# Altium integrated library PlantiumIntegratedLibrary.IntLib: 638 symbols (part 4 of 6) (continued)
## SC-P82B96TDT (continued)
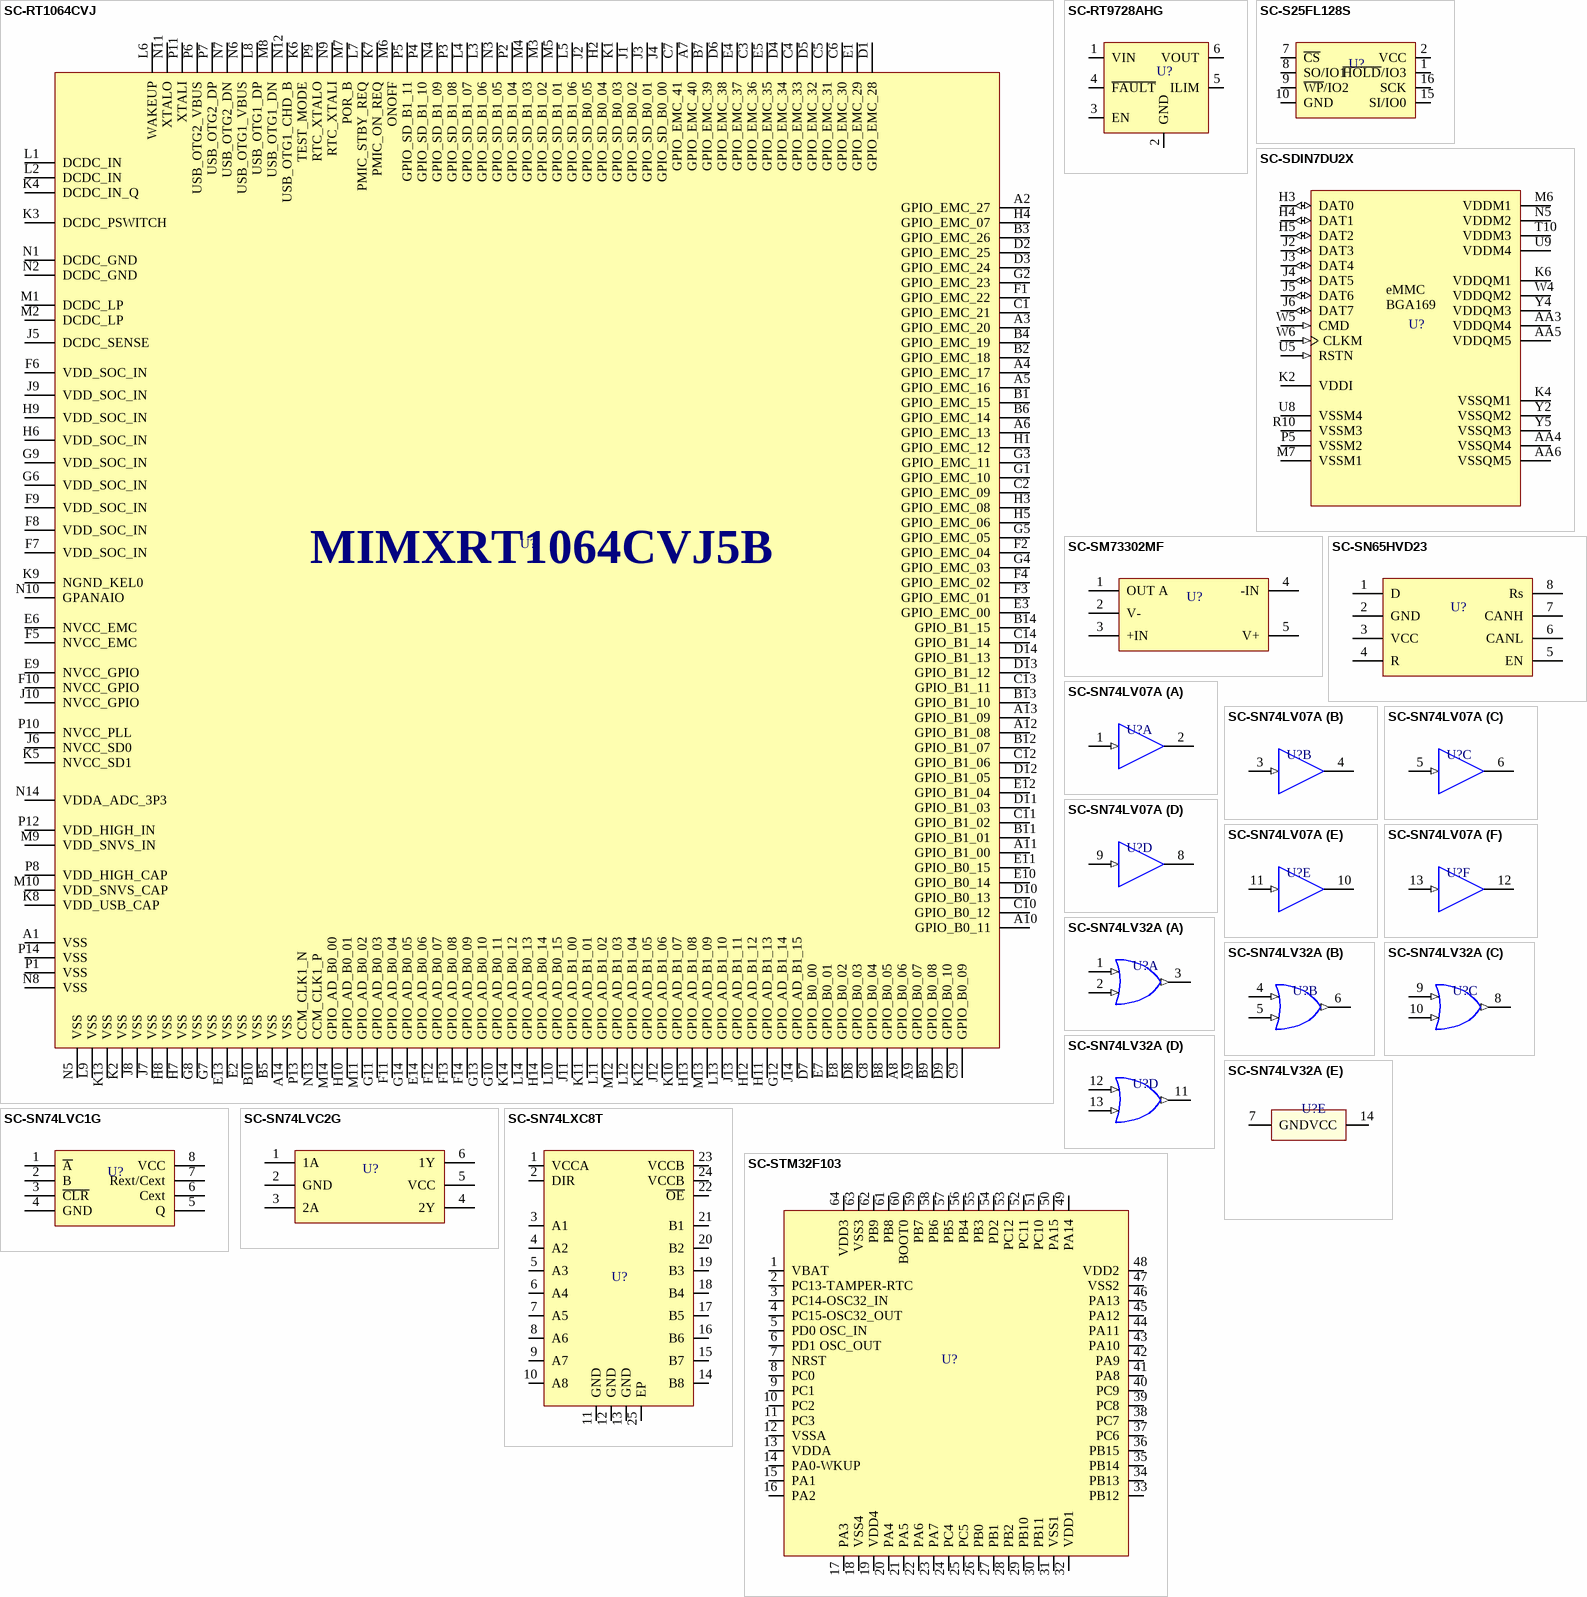
[diagram p20: symbols SC-RT1064CVJ to SC-STM32F103]

## SC-RT1064CVJ
designator U?
ARM® Cortex®-M7 series Microcontroller IC 32-Bit 528MHz 4MB (4M x 8) FLASH 196-LFBGA (12x12); Manufacturer Part Number: MIMXRT1064CVJ5B; Manufacturer: NXP USA Inc.; Working Temperature: -40°C ~ 105°C (TJ); Temperature Coefficient: NC; Short Description: IC MCU 32BIT 4MB FLASH 196LFBGA; Ratings: REACH, ROHS3; Voltage: 3V ~ 3.6V; Value: NC; Mounting: SMT; Power: NC; Type: NC; Frequency: 528MHz; Alternate Part Number 1: *; Alternate Part Number 2: *; Tolerance: NC; Current: NC; Revision Date: 25/08/21; Package Reference: LFBGA-196
footprint LFBGA-196_12x12
pins: A1 VSS, A2 GPIO_EMC_27, A3 GPIO_EMC_20, A4 GPIO_EMC_17, A5 GPIO_EMC_16, A6 GPIO_EMC_13, A7 GPIO_EMC_40, A8 GPIO_B0_06, A9 GPIO_B0_07, A10 GPIO_B0_11, A11 GPIO_B1_00, A12 GPIO_B1_08, A13 GPIO_B1_09, A14 VSS, B1 GPIO_EMC_15, B2 GPIO_EMC_18, B3 GPIO_EMC_26, B4 GPIO_EMC_19, B5 VSS, B6 GPIO_EMC_14, B7 GPIO_EMC_39, B8 GPIO_B0_05, B9 GPIO_B0_08, B10 VSS, B11 GPIO_B1_01, B12 GPIO_B1_07, B13 GPIO_B1_10, B14 GPIO_B1_15, C1 GPIO_EMC_21, C2 GPIO_EMC_09, C3 GPIO_EMC_36, C4 GPIO_EMC_33, C5 GPIO_EMC_31, C6 GPIO_EMC_30, C7 GPIO_EMC_41, C8 GPIO_B0_04, C9 GPIO_B0_09, C10 GPIO_B0_12, C11 GPIO_B1_02, C12 GPIO_B1_06, C13 GPIO_B1_11, C14 GPIO_B1_14, D1 GPIO_EMC_28, D2 GPIO_EMC_25, D3 GPIO_EMC_24, D4 GPIO_EMC_34, D5 GPIO_EMC_32, D6 GPIO_EMC_38, D7 GPIO_B0_00, D8 GPIO_B0_03, D9 GPIO_B0_10, D10 GPIO_B0_13, D11 GPIO_B1_03, D12 GPIO_B1_05, D13 GPIO_B1_12, D14 GPIO_B1_13, E1 GPIO_EMC_29, E2 VSS, E3 GPIO_EMC_00, E4 GPIO_EMC_37, E5 GPIO_EMC_35, E6 NVCC_EMC, E7 GPIO_B0_01, E8 GPIO_B0_02, E9 NVCC_GPIO, E10 GPIO_B0_14, E11 GPIO_B0_15, E12 GPIO_B1_04, E13 VSS, E14 GPIO_AD_B0_06, F1 GPIO_EMC_22, F2 GPIO_EMC_04, F3 GPIO_EMC_01, F4 GPIO_EMC_02, F5 NVCC_EMC, F6 VDD_SOC_IN, F7 VDD_SOC_IN, F8 VDD_SOC_IN, F9 VDD_SOC_IN, F10 NVCC_GPIO, F11 GPIO_AD_B0_04, F12 GPIO_AD_B0_07, F13 GPIO_AD_B0_08, F14 GPIO_AD_B0_09, G1 GPIO_EMC_10, G2 GPIO_EMC_23, G3 GPIO_EMC_11, G4 GPIO_EMC_03, G5 GPIO_EMC_05, G6 VDD_SOC_IN, G7 VSS, G8 VSS, G9 VDD_SOC_IN, G10 GPIO_AD_B0_11, G11 GPIO_AD_B0_03, G12 GPIO_AD_B1_14, G13 GPIO_AD_B0_10, G14 GPIO_AD_B0_05, H1 GPIO_EMC_12, H2 GPIO_SD_B0_04, H3 GPIO_EMC_08, H4 GPIO_EMC_07, H5 GPIO_EMC_06, H6 VDD_SOC_IN, H7 VSS, H8 VSS, H9 VDD_SOC_IN, H10 GPIO_AD_B0_01, H11 GPIO_AD_B1_13, H12 GPIO_AD_B1_12, H13 GPIO_AD_B1_08, H14 GPIO_AD_B0_14, J1 GPIO_SD_B0_02, J2 GPIO_SD_B0_05, J3 GPIO_SD_B0_01, J4 GPIO_SD_B0_00, J5 DCDC_SENSE, J6 NVCC_SD0, J7 VSS, J8 VSS, J9 VDD_SOC_IN, J10 NVCC_GPIO, J11 GPIO_AD_B1_00, J12 GPIO_AD_B1_06, J13 GPIO_AD_B1_11, J14 GPIO_AD_B1_15, K1 GPIO_SD_B0_03, K2 VSS, K3 DCDC_PSWITCH, K4 DCDC_IN_Q, K5 NVCC_SD1, K6 TEST_MODE, K7 PMIC_ON_REQ, K8 VDD_USB_CAP, K9 NGND_KEL0, K10 GPIO_AD_B1_07, K11 GPIO_AD_B1_01, K12 GPIO_AD_B1_05, K13 VSS, K14 GPIO_AD_B0_12, L1 DCDC_IN, L2 DCDC_IN, L3 GPIO_SD_B1_06, L4 GPIO_SD_B1_07, L5 GPIO_SD_B1_06, L6 WAKEUP, L7 PMIC_STBY_REQ, L8 USB_OTG1_DP, L9 VSS, L10 GPIO_AD_B0_15, L11 GPIO_AD_B1_02, L12 GPIO_AD_B1_04, L13 GPIO_AD_B1_10, L14 GPIO_AD_B0_13, M1 DCDC_LP, M2 DCDC_LP, M3 GPIO_SD_B1_02, M4 GPIO_SD_B1_03, M5 GPIO_SD_B1_01, M6 ONOFF, M7 POR_B, M8 USB_OTG1_DN, M9 VDD_SNVS_IN, M10 VDD_SNVS_CAP, M11 GPIO_AD_B0_02, M12 GPIO_AD_B1_03, M13 GPIO_AD_B1_09, M14 GPIO_AD_B0_00, N1 DCDC_GND, N2 DCDC_GND, N3 GPIO_SD_B1_05, N4 GPIO_SD_B1_09, N5 VSS, N6 USB_OTG1_VBUS, N7 USB_OTG2_DN, N8 VSS, N9 RTC_XTALI, N10 GPANAIO, N11 XTALO, N12 USB_OTG1_CHD_B, N13 CCM_CLK1_P, N14 VDDA_ADC_3P3, P1 VSS, P2 GPIO_SD_B1_04, P3 GPIO_SD_B1_08, P4 GPIO_SD_B1_10, P5 GPIO_SD_B1_11, P6 USB_OTG2_VBUS, P7 USB_OTG2_DP, P8 VDD_HIGH_CAP, P9 RTC_XTALO, P10 NVCC_PLL, P11 XTALI, P12 VDD_HIGH_IN, P13 CCM_CLK1_N, P14 VSS

## SC-RT9728AHG
designator U?
Power Switch/Driver 1:1 P-Channel 1.3A SOT-23-6; Manufacturer Part Number: RT9728AHGE; Manufacturer: Richtek USA Inc.; Working Temperature: -40°C ~ 85°C (TA); Temperature Coefficient: NC; Short Description: IC PWR SWITCH P-CHAN 1:1 SOT23-6; Ratings: REACH, ROHS3; Voltage: 2.5V ~ 5.5V; Value: NC; Mounting: SMT; Power: NC; Type: High Side; Frequency: NC; Alternate Part Number 1: *; Alternate Part Number 2: *; Tolerance: NC; Current: 1.3A; Revision Date: 03/08/21; Package Reference: SOT-23-6
footprint SOT-23-6 (Footprint not found)
pins: 1 VIN, 2 GND, 3 EN, 4 ~{FAULT} , 5 ILIM, 6 VOUT

## SC-S25FL128S
designator U?
FLASH - NOR Memory IC 128Mb (16M x 8) SPI - Quad I/O 133 MHz 16-SOIC; Manufacturer Part Number: S25FL128SAGMFI001; Manufacturer: Cypress Semiconductor Corp; Working Temperature: -40°C ~ 85°C (TA); Temperature Coefficient: NC; Short Description: IC FLASH 128MBIT SPI/QUAD 16SOIC; Ratings: REACH, ROHS3; Frequency: 133 MHz; Voltage: 2.7V ~ 3.6V; Value: NC; Mounting: SMT; Power: NC; Type: NC; Alternate Part Number 1: *; Alternate Part Number 2: *; Tolerance: NC; Current: NC; Revision Date: 17/11/21; Package Reference: 16-SOIC
footprint SOIC-16W
pins: 1 ~{HOLD}/IO3, 2 VCC, 7 ~{CS}, 8 SO/IO1, 9 ~{WP}/IO2, 10 GND, 15 SI/IO0, 16 SCK

## SC-SDIN7DU2X
designator U?
iNAND eMMC Flash 8Gb; Manufacturer Part Number: SDIN7DU2-8G; Manufacturer: Sandisk; Working Temperature: –25°C ~ +85°C; Temperature Coefficient: NC; Short Description: ND; Value: NC; Mounting: SMT; Power: NC; Ratings: *; Type: NC; Frequency: NC; Alternate Part Number 1: *; Alternate Part Number 2: *; Tolerance: NC; Current: NC; Revision Date: 03/08/21; Package Reference: *; Voltage: NC
footprint BGA-153
pins: AA3 VDDQM4 (power) "DQ Power", AA4 VSSQM4 (power) "DQ Ground", AA5 VDDQM5 (power) "DQ Power", AA6 VSSQM5 (power) "DQ Ground", H3 DAT0 (io) "Data Input/Output 0", H4 DAT1 (io) "Data Input/Output 1", H5 DAT2 (io) "Data Input/Output 2", J2 DAT3 (io) "Data Input/Output 3", J3 DAT4 (io) "Data Input/Output 4", J4 DAT5 (io) "Data Input/Output 5", J5 DAT6 (io) "Data Input/Output 6", J6 DAT7 (io) "Data Input/Output 7", K2 VDDI "No Connect", K4 VSSQM1 (power) "DQ Ground", K6 VDDQM1 (power) "DQ Power", M6 VDDM1 (power) "Power Supply", M7 VSSM1 (power) "Ground", N5 VDDM2 (power) "Power Supply", P5 VSSM2 (power) "Ground", R10 VSSM3 (power) "Ground", T10 VDDM3 (power) "Power Supply", U5 RSTN (in) "Clock Enable", U8 VSSM4 (power) "Ground", U9 VDDM4 (power) "Power Supply", W4 VDDQM2 (power) "DQ Power", W5 CMD (in) "Bank Address Input 1", W6 CLKM (in) "Clock", Y2 VSSQM2 (power) "DQ Ground", Y4 VDDQM3 (power) "DQ Power", Y5 VSSQM3 (power) "DQ Ground"
text: eMMC / BGA169

## SC-SM73302MF
designator U?
General Purpose Amplifier 1 Circuit Rail-to-Rail SOT-23-5; Manufacturer Part Number: SM73302MF/NOPB; Alternate Part Number 1: AD8601ARTZ; Manufacturer: Texas Instruments; Working Temperature: -40°C ~ 125°C; Temperature Coefficient: NC; Short Description: IC OPAMP GP 1 CIRCUIT SOT23-5; Ratings: ROHS3; Voltage: 2V ~ 5.5V; Value: NC; Mounting: SMT; Power: NC; Type: NC; Frequency: NC; Alternate Part Number 2: *; Tolerance: NC; Current: NC; Revision Date: 30/09/22; Package Reference: SOT-23-5
footprint SOT-23-5
pins: 1 OUT A, 2 V-, 3 +IN, 4 -IN, 5 V+

## SC-SN65HVD23
designator U?
1/1 Transceiver Half CANbus 8-SOIC; Manufacturer Part Number: SN65HVD234DR; Manufacturer: Texas Instruments; Working Temperature: -40°C ~ 125°C; Temperature Coefficient: NC; Short Description: IC TRANSCEIVER HALF 1/1 8SOIC; Ratings: REACH, ROHS3; Frequency: 1Mbps; Voltage: 3V ~ 3.6V; Value: NC; Mounting: SMT; Power: NC; Type: Half-Duplex; Alternate Part Number 1: *; Alternate Part Number 2: *; Tolerance: NC; Current: NC; Revision Date: 03/08/21; Package Reference: SOIC-8N
footprint SOIC-8N (Footprint not found)
pins: 1 D, 2 GND, 3 VCC, 4 R, 5 EN, 6 CANL, 7 CANH, 8 Rs

## SC-SN74LV07A
designator U?
Buffer, Non-Inverting 6 Element 1 Bit per Element Open Drain Output 14-TSSOP; Manufacturer Part Number: SN74LV07APWR; Manufacturer: Texas Instruments; Working Temperature: -40°C ~ 125°C (TA); Temperature Coefficient: NC; Short Description: IC BUF NON-INVERT 5.5V 14TSSOP; Ratings: REACH, ROHS3; Voltage: 2V ~ 5.5V; Value: NC; Mounting: SMT; Power: NC; Type: Buffer; Frequency: NC; Alternate Part Number 1: *; Alternate Part Number 2: *; Tolerance: NC; Current: NC; Revision Date: 03/08/21; Package Reference: TSSOP-14
footprint TSSOP-14 (Footprint not found)
part A pins: 1 A (in), 2 Y (oc)
part B pins: 3 A (in), 4 Y (oc)
part C pins: 5 A (in), 6 Y (oc)
part D pins: 8 Y (oc), 9 A (in)
part E pins: 10 Y (oc), 11 A (in)
part F pins: 12 Y (oc), 13 A (in)

## SC-SN74LV32A
designator U?
OR GATE, 4CH; Manufacturer Part Number: SN74LV32APWR; Manufacturer: Texas Instruments; Working Temperature: -40°C ~ 125°C (TA); Temperature Coefficient: NC; Short Description: IC GATE OR 4CH 2-INP; Ratings: ROHS3; Voltage: 2V ~ 5.5V; Value: NC; Mounting: SMT; Power: NC; Type: NC; Frequency: NC; Alternate Part Number 1: *; Alternate Part Number 2: *; Tolerance: NC; Current: NC; Revision Date: 26/06/23; Package Reference: TSSOP-14
footprint TSSOP-14
part A pins: 1 1A (in), 2 1B (in), 3 1Y (out)
part B pins: 4 2A (in), 5 2B (in), 6 2Y (out)
part C pins: 8 3Y (out), 9 3A (in), 10 3B (in)
part D pins: 11 3Y (out), 12 3A (in), 13 3B (in)
part E pins: 7 GND (power), 14 VCC (power)

## SC-SN74LVC1G
designator U?
Monostable Multivibrator 18.5 ns SM8; Manufacturer Part Number: SN74LVC1G123DCTR; Manufacturer: Texas Instruments; Working Temperature: -40°C ~ 125°C; Temperature Coefficient: NC; Short Description: IC MULTIVIBRATOR 18.5NS SM8; Ratings: REACH, ROHS3; Voltage: 1.65 V ~ 5.5 V; Value: NC; Mounting: SMT; Power: NC; Type: Monostable; Frequency: NC; Alternate Part Number 1: *; Alternate Part Number 2: *; Tolerance: NC; Current: NC; Revision Date: 03/08/21; Package Reference: MSOP-8
footprint MSOP-8 (Footprint not found)
pins: 1 ~{A}, 2 B, 3 ~{CLR}, 4 GND, 5 Q, 6 Cext, 7 Rext/Cext, 8 VCC

## SC-SN74LVC2G
designator U?
Buffer, Non-Inverting 2 Element 1 Bit per Element Open Drain Output SC-70-6; Manufacturer Part Number: SN74LVC2G07DCKR; Manufacturer: Texas Instruments; Working Temperature: -40°C ~ 125°C (TA); Temperature Coefficient: NC; Short Description: SN74LVC2G07 DUAL BUFFER/DRIVER W; Ratings: ND; Voltage: 1.65V ~ 5.5V; Value: NC; Mounting: SMT; Power: NC; Type: Buffer; Frequency: NC; Alternate Part Number 1: *; Alternate Part Number 2: *; Tolerance: NC; Current: NC; Revision Date: 03/08/21; Package Reference: SOT-363-6
footprint SOT-363-6 (Footprint not found)
pins: 1 1A, 2 GND, 3 2A, 4 2Y, 5 VCC, 6 1Y

## SC-SN74LXC8T
designator U?
Voltage Level Translator Bidirectional 1 Circuit 8 Channel 420Mbps 24-VQFN (5.5x3.5); Manufacturer Part Number: SN74LXC8T245RHLR; Manufacturer: Texas Instruments; Working Temperature: -40°C ~ 125°C (TA); Temperature Coefficient: NC; Short Description: 8-BIT DUAL-SUPPLY BUS TRANSCEIVE; Ratings: REACH, ROHS3; Value: NC; Mounting: SMT; Power: NC; Type: NC; Frequency: NC; Alternate Part Number 1: *; Alternate Part Number 2: *; Tolerance: NC; Current: NC; Revision Date: 24/09/21; Package Reference: VQFN-24; Voltage: NC
footprint VQFN-24_5.5X3.5
pins: 1 VCCA, 2 DIR, 3 A1, 4 A2, 5 A3, 6 A4, 7 A5, 8 A6, 9 A7, 10 A8, 11 GND, 12 GND, 13 GND, 14 B8, 15 B7, 16 B6, 17 B5, 18 B4, 19 B3, 20 B2, 21 B1, 22 ~{OE}, 23 VCCB, 24 VCCB, 25 EP

## SC-STM32F103
designator U?
ARM® Cortex®-M3 series Microcontroller IC 32-Bit 72MHz 256KB (256K x 8) FLASH 64-LQFP (10x10); Manufacturer Part Number: STM32F103RCT7; Manufacturer: STMicroelectronics; Working Temperature: -40°C ~ 105°C (TA); Temperature Coefficient: NC; Short Description: IC MCU 32BIT 256KB FLASH 64LQFP; Ratings: REACH, ROHS3; Voltage: 2V ~ 3.6V; Value: NC; Mounting: SMT; Power: NC; Type: ARM® Cortex®-M3; Frequency: 72MHz; Alternate Part Number 1: *; Alternate Part Number 2: *; Tolerance: NC; Current: NC; Revision Date: 03/08/21; Package Reference: LQFP-64
footprint LQFP-64 (Footprint not found)
pins: 1 VBAT, 2 PC13-TAMPER-RTC, 3 PC14-OSC32_IN, 4 PC15-OSC32_OUT, 5 PD0 OSC_IN, 6 PD1 OSC_OUT, 7 NRST, 8 PC0, 9 PC1, 10 PC2, 11 PC3, 12 VSSA, 13 VDDA, 14 PA0-WKUP, 15 PA1, 16 PA2, 17 PA3, 18 VSS4, 19 VDD4, 20 PA4, 21 PA5, 22 PA6, 23 PA7, 24 PC4, 25 PC5, 26 PB0, 27 PB1, 28 PB2, 29 PB10, 30 PB11, 31 VSS1, 32 VDD1, 33 PB12, 34 PB13, 35 PB14, 36 PB15, 37 PC6, 38 PC7, 39 PC8, 40 PC9, 41 PA8, 42 PA9, 43 PA10, 44 PA11, 45 PA12, 46 PA13, 47 VSS2, 48 VDD2, 49 PA14, 50 PA15, 51 PC10, 52 PC11, 53 PC12, 54 PD2, 55 PB3, 56 PB4, 57 PB5, 58 PB6, 59 PB7, 60 BOOT0, 61 PB8, 62 PB9, 63 VSS3, 64 VDD3

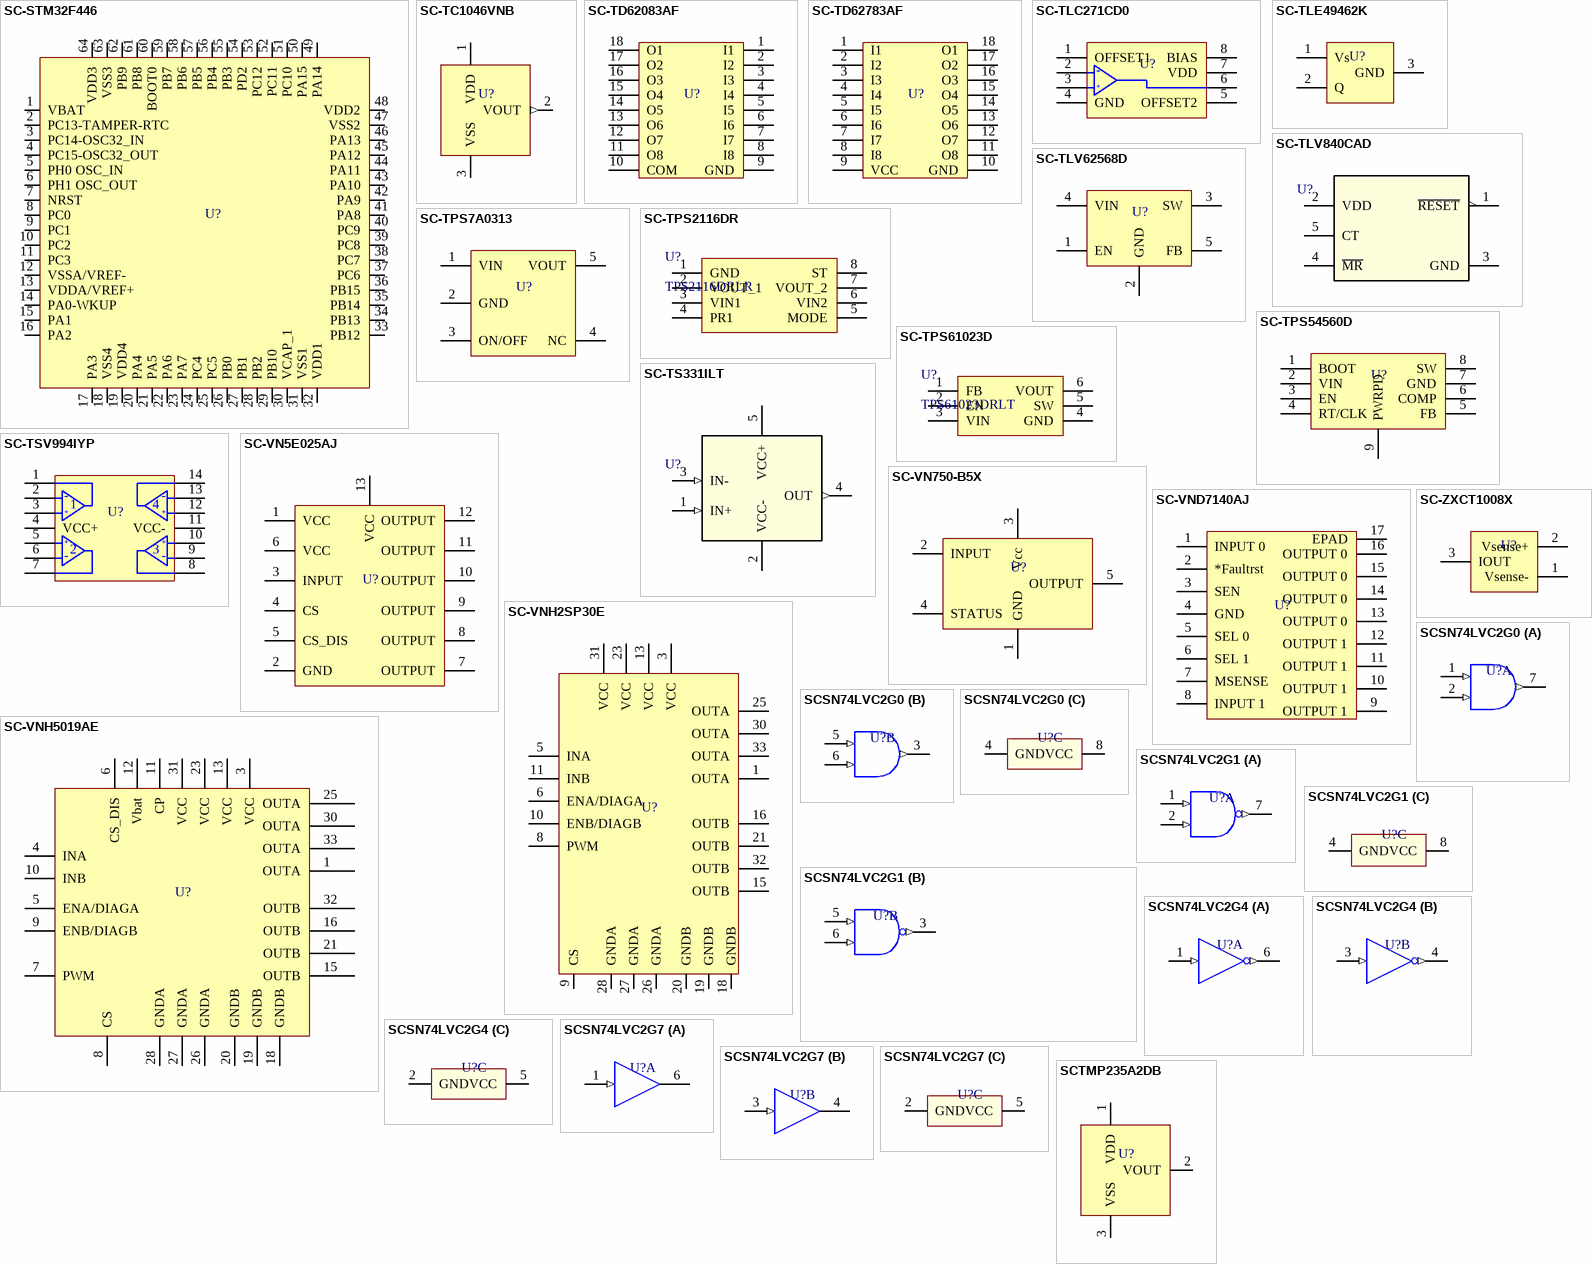
[diagram p21: symbols SC-STM32F446 to SCTMP235A2DB]

## SC-STM32F446
designator U?
ARM® Cortex®-M4 series Microcontroller IC 32-Bit 180MHz 512KB (512K x 8) FLASH 64-LQFP (10x10); Manufacturer Part Number: STM32F446RET6; Manufacturer: STMicroelectronics; Working Temperature: -40°C ~ 85°C (TA); Temperature Coefficient: NC; Short Description: IC MCU 32BIT 512KB FLASH 64LQFP; Ratings: REACH, ROHS3; Voltage: 1.7V ~ 3.6V; Value: NC; Mounting: SMT; Power: NC; Type: ARM® Cortex®-M4; Frequency: 180MHz; Alternate Part Number 1: *; Alternate Part Number 2: *; Tolerance: NC; Current: NC; Revision Date: 03/08/21; Package Reference: LQFP-64
footprint LQFP-64 (Footprint not found)
pins: 1 VBAT, 2 PC13-TAMPER-RTC, 3 PC14-OSC32_IN, 4 PC15-OSC32_OUT, 5 PH0 OSC_IN, 6 PH1 OSC_OUT, 7 NRST, 8 PC0, 9 PC1, 10 PC2, 11 PC3, 12 VSSA/VREF-, 13 VDDA/VREF+, 14 PA0-WKUP, 15 PA1, 16 PA2, 17 PA3, 18 VSS4, 19 VDD4, 20 PA4, 21 PA5, 22 PA6, 23 PA7, 24 PC4, 25 PC5, 26 PB0, 27 PB1, 28 PB2, 29 PB10, 30 VCAP_1, 31 VSS1, 32 VDD1, 33 PB12, 34 PB13, 35 PB14, 36 PB15, 37 PC6, 38 PC7, 39 PC8, 40 PC9, 41 PA8, 42 PA9, 43 PA10, 44 PA11, 45 PA12, 46 PA13, 47 VSS2, 48 VDD2, 49 PA14, 50 PA15, 51 PC10, 52 PC11, 53 PC12, 54 PD2, 55 PB3, 56 PB4, 57 PB5, 58 PB6, 59 PB7, 60 BOOT0, 61 PB8, 62 PB9, 63 VSS3, 64 VDD3

## SC-TC1046VNB
designator U?
Temperature Sensor Analog, Local -40°C ~ 125°C 6.25mV/°C SOT-23-3; Manufacturer Part Number: TC1046VNBTR; Manufacturer: Microchip Technology; Temperature Coefficient: NC; Short Description: SENSOR ANALOG -40C-125C SOT23-3; Ratings: REACH, ROHS3; Voltage: 2.7V ~ 4.4V; Value: NC; Working Temperature: -40°C ~ 125°C; Mounting: SMT; Power: NC; Type: Temperature Sensor; Frequency: NC; Alternate Part Number 1: *; Alternate Part Number 2: *; Tolerance: NC; Current: NC; Revision Date: 03/08/21; Package Reference: SOT-23-3; ComponentLink1Description: Datasheet; ComponentLink1URL: https://ww1.microchip.com/downloads/aemDocuments/documents/APID/ProductDocuments/DataSheets/21496C.pdf
footprint SOT-23-3 (Footprint not found)
pins: 1 VDD (power), 2 VOUT (out), 3 VSS (power)

## SC-TD62083AF
designator U?
8/0 D Darlington driver - 18-SSOP; Manufacturer Part Number: TD62083AFNG(O,N,EL; Manufacturer: Toshiba Semiconductor and Storage; Working Temperature: -40°C ~ 85°C; Temperature Coefficient: NC; Short Description: IC DRIVER 8/0 18SSOP; Ratings: ND; Current: 500mA; Voltage: 5V; Value: NC; Mounting: SMT; Power: NC; Type: Driver; Frequency: NC; Alternate Part Number 1: *; Alternate Part Number 2: *; Tolerance: NC; Revision Date: 03/08/21; Package Reference: SSOP-18
footprint SSOP-18 (Footprint not found)
pins: 1 I1, 2 I2, 3 I3, 4 I4, 5 I5, 6 I6, 7 I7, 8 I8, 9 GND, 10 COM, 11 O8, 12 O7, 13 O6, 14 O5, 15 O4, 16 O3, 17 O2, 18 O1

## SC-TD62783AF
designator U?
Source-type darlington driver; Manufacturer Part Number: TD62783AFNG(O,S); Manufacturer: Toshiba Semiconductor and Storage; Working Temperature: -40°C ~ 85°C; Temperature Coefficient: NC; Short Description: ND; Current: -500mA; Voltage: 5V; Value: NC; Mounting: SMT; Power: NC; Ratings: ND; Type: Driver; Frequency: NC; Alternate Part Number 1: *; Alternate Part Number 2: *; Tolerance: NC; Revision Date: 03/08/21; Package Reference: SSOP-18
footprint SSOP-18 (Footprint not found)
pins: 1 I1, 2 I2, 3 I3, 4 I4, 5 I5, 6 I6, 7 I7, 8 I8, 9 VCC, 10 GND, 11 O8, 12 O7, 13 O6, 14 O5, 15 O4, 16 O3, 17 O2, 18 O1

## SC-TLC271CD0
designator U?
General Purpose Amplifier Circuit - 8-SOIC; Manufacturer Part Number: TLC271CD; Manufacturer: Texas Instruments; Working Temperature: 0°C ~ 70°C; Temperature Coefficient: NC; Short Description: IC OPAMP GP 1 CIRCUIT 8SOIC; Ratings: REACH, ROHS3; Voltage: 3V ~ 16V, ±1.5V ~ 8V; Value: NC; Mounting: SMT; Power: NC; Type: OPAMP; Frequency: NC; Alternate Part Number 1: *; Alternate Part Number 2: *; Tolerance: NC; Current: NC; Revision Date: 03/08/21; Package Reference: SOIC-8N
footprint SOIC-8N (Footprint not found)
pins: 1 OFFSET1, 2 IN1-, 3 IN1+, 4 GND, 5 OFFSET2, 6 OUT, 7 VDD, 8 BIAS
text: -; +

## SC-TLE49462K
designator U?
Board Mount Hall Effect / Magnetic Sensors HALLEFFECT IC'S; Manufacturer Part Number: TLE4946-2K; Alternate Part Number 1: SS30AT; Alternate Part Number 2: S-57P1NBL8S-M3T4U; Manufacturer: Infineon Technologies; Working Temperature: -40°C ~ 140°C; Temperature Coefficient: NC; Short Description: HALL EFFECT SENSOR; Ratings: REACH, ROHS3, AECQ200; Current: 20mA; Voltage: 18V; Value: NC; Mounting: SMT; Power: NC; Type: LATCH; Frequency: NC; Tolerance: NC; Revision Date: 15/10/21; Package Reference: SOT-23-3
footprint SOT-23-3 (Footprint not found)
pins: 1 Vs, 2 Q, 3 GND

## SC-TLV840CAD
designator U?
Supervisor Open Drain or Open Collector 1 Channel SOT-23-5; Manufacturer Part Number: TLV840CADL14DBVR; Manufacturer: Texas Instruments; Working Temperature: –40°C to +125°C; Temperature Coefficient: NC; Short Description: LOW-VOLTAGE SUPERVISOR WITH ADJU; Ratings: ROHS3; REACH; EAR99; 8542.39.0001; Tolerance: 0.5%; Current: 120 nA; Voltage: 0.7 V to 6 V; Value: 1.4V; Mounting: SMD; Power: NC; Type: open-drain, active-low; Frequency: NC; Alternate Part Number 1: *; Alternate Part Number 2: *; Revision Date: 25/11/2022; Package Reference: SOT-23-5; ComponentLink1Description: Datasheet; ComponentLink1URL: https://www.ti.com/lit/ds/symlink/tlv840.pdf
footprint SOT-23-5
pins: 1 ~{RESET} (oc) "Active-Low Open-drain Output Reset Signal", 2 VDD (power) "Input Supply Voltage", 3 GND (power) "Ground", 4 ~{MR} "Manual Reset", 5 CT "Capacitor Time Delay Pin"

## SC-TLV62568D
designator U?
Buck Switching Regulator IC Positive Adjustable 0.6V 1 Output 1A SC-74A, SOT-753; Manufacturer Part Number: TLV62568DBVR; Alternate Part Number 1: NX4108CZ1TR; Manufacturer: Texas Instruments; Working Temperature: -40°C ~ 125°C (TJ); Temperature Coefficient: NC; Short Description: IC REG BUCK ADJ 1A SOT23-5; Ratings: REACH, ROHS3; Frequency: 1.5MHz; Voltage: 5.5V; Value: NC; Mounting: SMT; Power: NC; Type: Buck; Alternate Part Number 2: *; Tolerance: NC; Current: 1A; Revision Date: 03/08/21; Package Reference: SOT-23-5
footprint SOT-23-5 (Footprint not found)
pins: 1 EN, 2 GND, 3 SW, 4 VIN, 5 FB

## SC-TPS7A0313
designator U?
Linear Voltage Regulator IC Positive Fixed 1 Output 200mA SOT-23-5; Manufacturer Part Number: TPS7A0313PDBVR; Alternate Part Number 1: S-1312D13-M5T1U3; Manufacturer: Texas Instruments; Working Temperature: -40°C ~ 125°C (TJ); Temperature Coefficient: NC; Short Description: 200-MA, NANOPOWER-IQ (200 NA), L; Ratings: ROHS3; Value: NC; Mounting: SMT; Power: NC; Type: LDO; Frequency: NC; Alternate Part Number 2: *; Tolerance: NC; Current: 200mA; Revision Date: 23/11/21; Package Reference: SOT-23-5; Voltage: NC
footprint SOT-23-5
pins: 1 VIN, 2 GND, 3 ON/OFF, 4 NC, 5 VOUT

## SC-TPS2116DR
designator U?, comment TPS2116DRLR
Power Switch ICs - Power Distribution 1.6-V to 5.5-V, 40-mOhm, 2.5-A, low-IQ, priority power multiplexer; Manufacturer_Name: Texas Instruments; Datasheet Link: https://www.ti.com/lit/gpn/tps2116; Height: 0.6mm; Manufacturer_Part_Number: TPS2116DRLR; Mounting: SMT
footprint SOT-5X3-8
pins: 1 GND, 2 VOUT_1, 3 VIN1, 4 PR1, 5 MODE, 6 VIN2, 7 VOUT_2, 8 ST

## SC-TPS54560D
designator U?
Buck, Split Rail Switching Regulator IC Positive Adjustable 0.8V 1 Output 5A 8-PowerSOIC (0.154", 3.90mm Width); Manufacturer Part Number: TPS54560DDA; Alternate Part Number 1: TPS54560DDAR; Manufacturer: Texas Instruments; Working Temperature: -40°C ~ 150°C (TJ); Temperature Coefficient: NC; Short Description: IC REG BCK SPLIT RAIL ADJ 8SOPWR; Ratings: REACH, ROHS3; Frequency: 100kHz ~ 2.5MHz; Voltage: 58.8V; Value: NC; Mounting: SMT; Power: NC; Type: Step-Down; Alternate Part Number 2: *; Tolerance: NC; Current: 5A; Revision Date: 03/08/21; Package Reference: SOIC-8EP
footprint SOIC-8EP (Footprint not found)
pins: 1 BOOT, 2 VIN, 3 EN, 4 RT/CLK, 5 FB, 6 COMP, 7 GND, 8 SW, 9 PWRPD

## SC-TPS61023D
designator U?, comment TPS61023DRLT
Switching Voltage Regulators 3.7-A boost converter with 0.5-V ultra-low input voltage for super capacitor; Manufacturer_Name: Texas Instruments; Datasheet Link: http://www.ti.com/general/docs/suppproductinfo.tsp?distId=10&gotoUrl=http%3A%2F%2Fwww.ti.com%2Flit%2Fgpn%2Ftps61023; Height: 0.6mm; Manufacturer_Part_Number: TPS61023DRLT; Mounting: SMT
footprint SOT-5X3
pins: 1 FB, 2 EN, 3 VIN, 4 GND, 5 SW, 6 VOUT

## SC-TS331ILT
designator U?
Comparator General Purpose Open-Drain SOT-23-5; Manufacturer Part Number: TS331ILT; Manufacturer: STMicroelectronics; Working Temperature: -40°C ~ 125°C; Temperature Coefficient: NC; Short Description: IC COMPARATOR 1 GEN PUR SOT23-5; Ratings: ROHS3, REACH; Current: 93mA @ 5V; Voltage: 1.6V ~ 5V; Value: NC; Mounting: SMD; Power: NC; Type: NC; Frequency: NC; Alternate Part Number 1: *; Alternate Part Number 2: *; Tolerance: NC; Revision Date: 04/07/2023; Package Reference: SC-74A, SOT-753; ComponentLink1Description: Datasheet; ComponentLink1URL: https://www.st.com/content/ccc/resource/technical/document/datasheet/cc/dc/2c/5f/27/46/4b/b7/CD00268545.pdf/files/CD00268545.pdf/jcr:content/translations/en.CD00268545.pdf
footprint SOT-23-5
pins: 1 IN+ (in), 2 VCC- (power), 3 IN- (in), 4 OUT (out), 5 VCC+ (power)

## SC-TSV994IYP
designator U?
General Purpose Amplifier 4 Circuit Rail-to-Rail 14-TSSOP; Manufacturer Part Number: TSV994IYPT; Manufacturer: STMicroelectronics; Working Temperature: -40°C ~ 125°C; Temperature Coefficient: NC; Short Description: IC OPAMP GP 4 CIRCUIT 14TSSOP; Ratings: REACH, ROHS3; Current: 35mA; Voltage: 2.5V ~ 5.5V; Value: NC; Mounting: SMT; Power: NC; Type: Rail-to-Rail; Frequency: NC; Alternate Part Number 1: *; Alternate Part Number 2: *; Tolerance: NC; Revision Date: 03/08/21; Package Reference: TSSOP-14
footprint TSSOP-14 (Footprint not found)
pins: 1 OUT1, 2 IN1-, 3 IN1+, 4 VCC+, 5 IN2+, 6 IN2-, 7 OUT2, 8 OUT3, 9 IN3-, 10 IN3+, 11 VCC-, 12 IN4+, 13 IN4-, 14 OUT4
text: -; +

## SC-VN5E025AJ
designator U?
Power Switch/Driver 1:1 N-Channel 43A PowerSSO-12™; Manufacturer Part Number: VN5E025AJTR-E; Manufacturer: STMicroelectronics; Working Temperature: -40°C ~ 150°C (TJ); Temperature Coefficient: NC; Short Description: IC PWR SWTCH N-CHAN 1:1 PWRSSO12; Ratings: REACH, ROHS3; Voltage: 4.5V ~ 28V; Value: NC; Mounting: SMT; Power: NC; Type: High Side; Frequency: NC; Alternate Part Number 1: *; Alternate Part Number 2: *; Tolerance: NC; Current: 43A; Revision Date: 23/08/21; Package Reference: *; ComponentLink1Description: Datasheet; ComponentLink1URL: https://www.st.com/content/ccc/resource/technical/document/datasheet/group2/1a/41/27/ac/c1/66/41/fd/CD00149619/files/CD00149619.pdf/jcr:content/translations/en.CD00149619.pdf
footprint POWERSSO-12
pins: 1 VCC, 2 GND, 3 INPUT, 4 CS, 5 CS_DIS, 6 VCC, 7 OUTPUT, 8 OUTPUT, 9 OUTPUT, 10 OUTPUT, 11 OUTPUT, 12 OUTPUT, 13 VCC

## SC-VN750-B5X
designator U?
Power Switch/Driver 1:1 N-Channel 6A P2PAK; Manufacturer Part Number: VN750-B5; Manufacturer: STMicroelectronics; Working Temperature: -40°C ~ 150°C (TJ); Temperature Coefficient: NC; Short Description: IC PWR DRIVER N-CHAN 1:1 P2PAK; Ratings: REACH; Voltage: 5.5V ~ 36V; Value: NC; Mounting: SMT; Power: NC; Type: High-Side; Frequency: NC; Alternate Part Number 1: *; Alternate Part Number 2: *; Tolerance: NC; Current: 6A; Revision Date: 03/08/21; Package Reference: P2PAK
footprint P2PAK (Footprint not found)
pins: 1 GND, 2 INPUT, 3 Vcc, 4 STATUS, 5 OUTPUT

## SC-VND7140AJ
designator U?  (value not drawn)
Power Switch/Driver 1:1 N-Channel 8A PowerSSO-16; Manufacturer Part Number: VND7140AJTR; Manufacturer: STMicroelectronics; Working Temperature: -40°C ~ 150°C (TJ); Temperature Coefficient: NC; Short Description: IC PWR DRVR N-CHAN 1:1 PWRSSO16; Ratings: REACH, ROHS3; Voltage: 4V ~ 28V; Value: NC; Mounting: SMT; Power: NC; Type: High Side; Frequency: NC; Alternate Part Number 1: *; Alternate Part Number 2: *; Tolerance: NC; Current: 8A; Revision Date: 23/08/21; Package Reference: *
footprint PowerSSO-16
pins: 1 INPUT 0, 2 *Faultrst, 3 SEN, 4 GND, 5 SEL 0, 6 SEL 1, 7 MSENSE, 8 INPUT 1, 9 OUTPUT 1, 10 OUTPUT 1, 11 OUTPUT 1, 12 OUTPUT 1, 13 OUTPUT 0, 14 OUTPUT 0, 15 OUTPUT 0, 16 OUTPUT 0, 17 EPAD

## SC-VNH2SP30E
designator U?
Motor Driver Power MOSFET PWM MultiPowerSO-30; Manufacturer Part Number: VNH2SP30-E; Manufacturer: STMicroelectronics; Working Temperature: -40°C ~ 150°C (TJ); Temperature Coefficient: NC; Short Description: IC MTR DRV 5.5-16V MULTIPWRSO-30; Ratings: REACH, ROHS3; Current: 30A; Value: NC; Mounting: SMT; Power: NC; Type: H-Bridge; Frequency: NC; Alternate Part Number 1: *; Alternate Part Number 2: *; Tolerance: NC; Revision Date: 03/08/21; Package Reference: MultiPowerSO-30; Voltage: NC
footprint MULTIPOWERSO-30 (Footprint not found)
pins: 1 OUTA, 3 VCC, 5 INA, 6 ENA/DIAGA, 8 PWM, 9 CS, 10 ENB/DIAGB, 11 INB, 13 VCC, 15 OUTB, 16 OUTB, 18 GNDB, 19 GNDB, 20 GNDB, 21 OUTB, 23 VCC, 25 OUTA, 26 GNDA, 27 GNDA, 28 GNDA, 30 OUTA, 31 VCC, 32 OUTB, 33 OUTA

## SC-VNH5019AE
designator U?
Motor Driver Power MOSFET Parallel, PWM MultiPowerSO-30; Manufacturer Part Number: VNH5019ATR-E; Manufacturer: STMicroelectronics; Working Temperature: -40°C ~ 150°C (TJ); Temperature Coefficient: NC; Short Description: IC MTR DRV 5.5-24V MULTIPWRSO-30; Ratings: REACH, ROHS3; Current: 30A; Value: NC; Mounting: SMT; Power: NC; Type: H-Bridge; Frequency: NC; Alternate Part Number 1: *; Alternate Part Number 2: *; Tolerance: NC; Revision Date: 03/08/21; Package Reference: MultiPowerSO-30; Voltage: NC
footprint MULTIPOWERSO-30 (Footprint not found)
pins: 1 OUTA, 3 VCC, 4 INA, 5 ENA/DIAGA, 6 CS_DIS, 7 PWM, 8 CS, 9 ENB/DIAGB, 10 INB, 11 CP, 12 Vbat, 13 VCC, 15 OUTB, 16 OUTB, 18 GNDB, 19 GNDB, 20 GNDB, 21 OUTB, 23 VCC, 25 OUTA, 26 GNDA, 27 GNDA, 28 GNDA, 30 OUTA, 31 VCC, 32 OUTB, 33 OUTA

## SC-ZXCT1008X
designator U?
Current Monitor Regulator High-Side 25mA SOT-23-3; Manufacturer Part Number: ZXCT1008FTA; Manufacturer: Diodes Incorporated; Working Temperature: -40°C ~ 85°C; Temperature Coefficient: NC; Short Description: IC CURRENT MONITOR 1% SOT23-3; Ratings: REACH, ROHS3; Voltage: 2.5V ~ 20V; Value: NC; Mounting: SMT; Power: NC; Type: Current Monitor; Frequency: NC; Alternate Part Number 1: *; Alternate Part Number 2: *; Tolerance: NC; Current: NC; Revision Date: 03/08/21; Package Reference: SOT-23-3
footprint SOT-23-3 (Footprint not found)
pins: 1 Vsense-, 2 Vsense+, 3 IOUT

## SCSN74LVC2G0
designator U?
AND GATE, 2CH, 8VSSOP; Manufacturer Part Number: SN74LVC2G08DCUR; Manufacturer: Texas Instruments; Working Temperature: -40°C ~ 125°C (TA); Temperature Coefficient: NC; Short Description: AND Gate IC 2 Channel 8-VSSOP; Ratings: ROHS3; Voltage: 1.65V ~ 5.5V; Value: NC; Mounting: SMT; Power: NC; Type: NC; Frequency: NC; Alternate Part Number 1: *; Alternate Part Number 2: *; Tolerance: NC; Current: NC; Revision Date: 26/06/23; Package Reference: VSSOP-8
footprint VSSOP-8_P0.5
part A pins: 1 1A (in), 2 1B (in), 7 1Y (out)
part B pins: 3 2Y (out), 5 2A (in), 6 2B (in)
part C pins: 4 GND (power), 8 VCC (power)

## SCSN74LVC2G1
designator U?
NAND SCHMITT TRIGGER GATE, 2CH, SM8; Manufacturer Part Number: SN74LVC2G132DCTR; Manufacturer: Texas Instruments; Working Temperature: -40°C ~ 125°C (TA); Temperature Coefficient: NC; Short Description: NAND Gate IC 2 Channel Schmitt Trigger SM8; Ratings: ROHS3; Voltage: 1.65V ~ 5.5V; Value: NC; Mounting: SMT; Power: NC; Type: NC; Frequency: NC; Alternate Part Number 1: *; Alternate Part Number 2: *; Tolerance: NC; Current: NC; Revision Date: 26/06/23; Package Reference: SM8
footprint SSOP-8
part A pins: 1 1A (in), 2 1B (in), 7 1Y (out)
part B pins: 3 2Y (out), 5 2A (in), 6 2B (in)
part C pins: 4 GND (power), 8 VCC (power)

## SCSN74LVC2G4
designator U?
INVERTER GATE, 2CH; Manufacturer Part Number: SN74LVC2G04DBVR; Manufacturer: Texas Instruments; Working Temperature: -40°C ~ 125°C (TA); Temperature Coefficient: NC; Short Description: Inverter IC 2 Channel; Ratings: ROHS3; Voltage: 1.65V ~ 5.5V; Value: NC; Mounting: SMT; Power: NC; Type: NC; Frequency: NC; Alternate Part Number 1: *; Alternate Part Number 2: *; Tolerance: NC; Current: NC; Revision Date: 26/06/23; Package Reference: SOT-23
footprint SOT-23-6
part A pins: 1 1A (in), 6 1Y (out)
part B pins: 3 2A (in), 4 2Y (out)
part C pins: 2 GND (power), 5 VCC (power)

## SCSN74LVC2G7
designator U?
BUFFER NON-INVERT, 2CH, SOT23-6; Manufacturer Part Number: SN74LVC2G07DBVR; Manufacturer: Texas Instruments; Working Temperature: -40°C ~ 125°C (TA); Temperature Coefficient: NC; Short Description: Buffer, Non-Inverting 2 Element 1 Bit per Element Open Drain Output SOT-23-6; Ratings: ROHS3; Voltage: 1.65V ~ 5.5V; Value: NC; Mounting: SMT; Power: NC; Type: NC; Frequency: NC; Alternate Part Number 1: *; Alternate Part Number 2: *; Tolerance: NC; Current: NC; Revision Date: 26/06/23; Package Reference: SOT-23-6
footprint SOT-23-6
part A pins: 1 1A (in), 6 1Y (oc)
part B pins: 3 2A (in), 4 2Y (oc)
part C pins: 2 GND (power), 5 VCC (power)

## SCTMP235A2DB
designator U?  (value not drawn)
Sensores de temperatura montados en placa +/-1.2 C 2.3V to 5.5V analog output temperature sensor with 10 mV/C gain 3-SOT-23 -40 to 150; Manufacturer Part Number: TMP235A2DBZR; Manufacturer: Texas Instruments; Working Temperature: -40°C ~ 150°C; Temperature Coefficient: 10 mV/C; Short Description: SENSOR ANALOG -40C-125C SOT23-3; Power: NC; Ratings: REACH, ROHS3; Tolerance: +/- 0.5 C; Voltage: 2.3V ~ 5.5V; Value: NC; Mounting: SMT; Type: Temperature Sensor; Frequency: NC; Alternate Part Number 1: *; Alternate Part Number 2: *; Current: NC; Revision Date: 03/08/21; Package Reference: SOT-23-3
footprint SOT-23-3 (Footprint not found)
pins: 1 VDD, 2 VOUT, 3 VSS


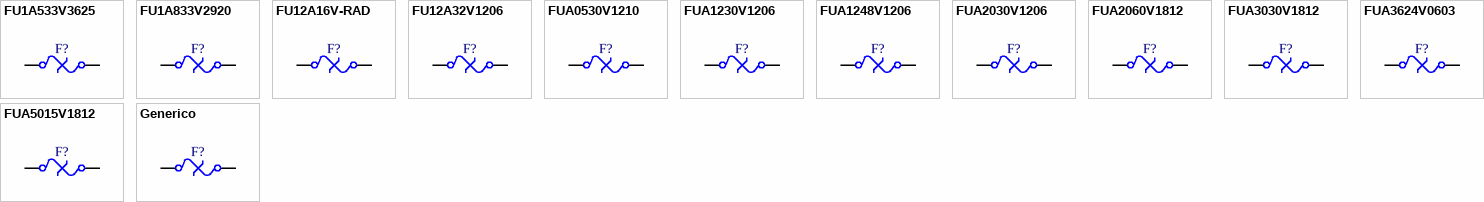
[diagram p22: symbols FU1A533V3625 to Generico]

## FU1A533V3625
designator F?
Polymeric PTC Resettable Fuse 33V 1.5 A Ih Surface Mount 2-SMD; Manufacturer Part Number: MF-SM150/33-2; Manufacturer: Bourns Inc.; Working Temperature: -40°C ~ 85°C; Temperature Coefficient: NC; Short Description: PTC RESET FUSE 33V 1.5A 2SMD; Ratings: REACH, ROHS3, AEC-Q200; Current: 3; Voltage: 33; Value: 1.5; Mounting: SMT; Power: NC; Type: PTC; Frequency: NC; Alternate Part Number 2: *; Tolerance: NC; Revision Date: 03/08/21; Package Reference: 3426
footprint F3426
pins: 1, 2

## FU1A833V2920
designator F?
Polymeric PTC Resettable Fuse 33V 1.85 A Ih Surface Mount 2920 (7351 Metric), Concave; Manufacturer Part Number: 2920L185DR; Manufacturer: Littelfuse Inc.; Working Temperature: -40°C ~ 85°C; Temperature Coefficient: NC; Short Description: PTC RESET FUSE 33V 1.85A 2920; Ratings: ROHS3; Current: 3.7; Voltage: 33; Value: 1.85; Mounting: SMT; Power: NC; Type: PTC; Frequency: NC; Alternate Part Number 2: *; Tolerance: NC; Revision Date: 03/08/21; Package Reference: 2920
footprint F2920
pins: 1, 2

## FU12A16V-RAD
designator F?
Polymeric PTC Resettable Fuse 16V 12 A Ih Through Hole Radial, Disc; Manufacturer Part Number: RGEF1200; Manufacturer: Littelfuse Inc.; Working Temperature: -40°C ~ 85°C; Temperature Coefficient: NC; Short Description: PTC RESET FUSE 16V 12A RADIAL; Ratings: ROHS3; Current: 20.4; Voltage: 16; Value: 12; Mounting: THT; Power: NC; Type: PTC; Frequency: NC; Alternate Part Number 2: *; Tolerance: NC; Revision Date: 03/08/21; Package Reference: Radial
footprint RGEF1200
pins: 1, 2

## FU12A32V1206
designator F?  (value not drawn)
12 A 32 V AC 32 V DC Fuse Board Mount (Cartridge Style Excluded) Surface Mount 1206 (3216 Metric); Manufacturer Part Number: TR/3216TD12-R; Manufacturer: Eaton - Electronics Division; Working Temperature: -55°C ~ 125°C; Temperature Coefficient: NC; Short Description: FUSE BRD MNT 12A 32VAC/DC 1206; Ratings: REACH, ROHS3, AEC-Q200; Type: PTC; Current: 12 A; Voltage: 32 V; Value: 12 A; Mounting: SMT; Power: NC; Frequency: NC; Alternate Part Number 2: *; Tolerance: NC; Revision Date: 03/08/21; Package Reference: 1206
footprint F1206
pins: 1, 2

## FUA0530V1210
designator F?
Polymeric PTC Resettable Fuse 30V 50 mA Ih Surface Mount 1210 (3225 Metric), Concave; Manufacturer Part Number: MICROSMD005F-2; Manufacturer: Littelfuse Inc.; Working Temperature: -40°C ~ 85°C; Temperature Coefficient: NC; Short Description: PTC RESET FUSE 30V 50MA 1210; Ratings: ROHS3; Current: 150m; Voltage: 30; Value: 50m; Mounting: SMT; Power: NC; Type: PTC; Frequency: NC; Alternate Part Number 2: *; Tolerance: NC; Revision Date: 03/08/21; Package Reference: 1210
footprint F1210
pins: 1, 2

## FUA1230V1206
designator F?
Polymeric PTC Resettable Fuse 30V 120 mA Ih Surface Mount 1206 (3216 Metric), Concave; Manufacturer Part Number: MF-NSMF012-2; Manufacturer: Bourns Inc.; Working Temperature: -40°C ~ 85°C; Temperature Coefficient: NC; Short Description: PTC RESET FUSE 30V 120MA 1206; Ratings: REACH, ROHS3, AEC-Q200; Current: 290m; Voltage: 30; Value: 120m; Mounting: SMT; Power: NC; Type: PTC; Frequency: NC; Alternate Part Number 2: *; Tolerance: NC; Revision Date: 03/08/21; Package Reference: 1206
footprint F1206
pins: 1, 2

## FUA1248V1206
designator F?
Polymeric PTC Resettable Fuse 48V 120 mA Ih Surface Mount 1206 (3216 Metric), Concave; Manufacturer Part Number: 0ZCJ0012FF2E; Manufacturer: Bel Fuse Inc.; Working Temperature: -40°C ~ 85°C; Temperature Coefficient: NC; Short Description: PTC RESET FUSE 48V 120MA 1206; Ratings: REACH, ROHS3, AEC-Q200; Current: 390m; Voltage: 48; Value: 120m; Mounting: SMT; Power: NC; Type: PTC; Frequency: NC; Alternate Part Number 2: *; Tolerance: NC; Revision Date: 03/08/21; Package Reference: 1206
footprint F1206
pins: 1, 2

## FUA2030V1206
designator F?
Polymeric PTC Resettable Fuse 30V 200 mA Ih Surface Mount 1206 (3216 Metric), Concave; Manufacturer Part Number: MF-NSMF020X-2; Manufacturer: Bourns Inc.; Working Temperature: -40°C ~ 85°C; Temperature Coefficient: NC; Short Description: PTC RESET FUSE 30V 200MA 1206; Ratings: REACH, ROHS3, AEC-Q200; Current: Curr. Trip (It) 400mA, Max 60A; Voltage: 30; Value: Curr. Hold (Ih) 200mA; Mounting: SMT; Power: NC; Type: PTC; Frequency: NC; Alternate Part Number 2: *; Tolerance: NC; Revision Date: 03/08/21; Package Reference: 1206
footprint F1206
pins: 1, 2

## FUA2060V1812
designator F?
Polymeric PTC Resettable Fuse 60V 200 mA Ih Surface Mount 1812 (4532 Metric), Concave; Manufacturer Part Number: 0ZCG0020AF2C; Manufacturer: Bel Fuse Inc.; Working Temperature: -40°C ~ 85°C; Temperature Coefficient: NC; Short Description: PTC RESET FUSE 60V 200MA 1812; Ratings: REACH, ROHS3, AEC-Q200; Current: Curr. Trip (It) 400mA, Max 40A; Voltage: 60; Value: Curr. Hold (Ih) 200mA; Mounting: SMT; Power: NC; Type: PTC; Frequency: NC; Alternate Part Number 2: *; Tolerance: NC; Revision Date: 11/07/22; Package Reference: 1812 (4532 Metric)
footprint F1812
pins: 1, 2

## FUA3030V1812
designator F?
Polymeric PTC Resettable Fuse 30V 300 mA Ih Surface Mount 1812 (4532 Metric), Concave; Manufacturer Part Number: MF-MSMF030-2; Manufacturer: Bourns Inc.; Working Temperature: -40°C ~ 85°C; Temperature Coefficient: NC; Short Description: PTC RESET FUSE 30V 300MA 1812; Ratings: REACH, ROHS3, AEC-Q200; Current: 600m; Voltage: 30; Value: 300m; Mounting: SMT; Power: NC; Type: PTC; Frequency: NC; Alternate Part Number 2: *; Tolerance: NC; Revision Date: 03/08/21; Package Reference: 1812
footprint F1812
pins: 1, 2

## FUA3624V0603
designator F?
Ceramic PTC Resettable Fuse 24V 36 mA Ih Surface Mount 0603 (1608 Metric); Manufacturer Part Number: PRG18BB330MB1RB; Manufacturer: Murata Electronics; Working Temperature: -20°C ~ 75°C; Temperature Coefficient: NC; Short Description: PTC RESET FUSE 24V 36MA 0603; Ratings: ROHS3; Current: 71m; Voltage: 24; Value: 36m; Mounting: SMT; Power: NC; Type: PTC; Frequency: NC; Alternate Part Number 2: *; Tolerance: NC; Revision Date: 03/08/21; Package Reference: 0603
footprint F0603
pins: 1, 2

## FUA5015V1812
designator F?
Polymeric PTC Resettable Fuse 15V 500 mA Ih Surface Mount 1812 (4532 Metric), Concave; Manufacturer Part Number: MF-MSMF050-2; Manufacturer: Bourns Inc.; Working Temperature: -40°C ~ 85°C; Temperature Coefficient: NC; Short Description: PTC RESET FUSE 15V 500MA 1812; Ratings: REACH, ROHS3, AEC-Q200; Current: 1; Voltage: 15; Value: 500m; Mounting: SMT; Power: NC; Type: PTC; Frequency: NC; Alternate Part Number 2: *; Tolerance: NC; Revision Date: 03/08/21; Package Reference: 1812
footprint F1812
pins: 1, 2

## Generico
designator F?
Manufacturer Part Number: *; Working Temperature: *; Temperature Coefficient: *; Mounting: *; Short Description: *; Power: *; Ratings: *; Type: *; Frequency: *; Alternate Part Number 1: *; Alternate Part Number 2: *; Manufacturer: *; Tolerance: *; Current: *; Revision Date: *; Package Reference: *; Voltage: *; Value: *
pins: 1, 2
